# Altium footprint library ModulesFPs.PcbLib: 7 footprints (part 3 of 6) (continued)
## ARDUINO MEGA 2560 PRO M-SHIELD [mm] (continued)
3D body: height 7, standoff 0, extent 2.007,-48.793 3.073,-48.742
3D body: height 7, standoff 0, extent 2.007,-48.793 2.057,-47.726
3D body: height 8, standoff 0, extent 1.27,-49.53 1.549,-46.99
3D body: height 0, standoff -3, extent 2.286,-48.387 2.794,-48.133
3D body: height 8, standoff 0, extent 3.531,-49.53 3.81,-46.99
3D body: height 8, standoff 0, extent 1.27,-49.53 3.81,-49.251
3D body: height 7.5, standoff 0, extent 2.007,-48.793 2.032,-47.727
3D body: height 7.5, standoff 0, extent 2.007,-47.752 3.074,-47.727
3D body: height 7, standoff 0, extent 2.007,-47.777 3.073,-47.726
3D body: height 7.5, standoff 0, extent 3.048,-46.253 3.073,-45.187
3D body: height 7.5, standoff 0, extent 2.007,-46.253 3.073,-46.228
3D body: height 8, standoff 7.5, extent 1.524,-46.728 3.556,-46.228
3D body: height 8, standoff 7.5, extent 1.524,-45.212 3.556,-44.711
3D body: height 8, standoff 7.5, extent 1.532,-46.761 2.032,-44.729
3D body: height 8, standoff 0, extent 1.27,-44.729 3.81,-44.45
3D body: height 1, standoff 0, extent 1.905,-46.355 3.175,-45.085
3D body: height 7, standoff 0, extent 3.023,-46.253 3.073,-45.186
3D body: height 7, standoff 0, extent 2.007,-46.253 3.073,-46.202
3D body: height 7, standoff 0, extent 2.007,-46.253 2.057,-45.186
3D body: height 8, standoff 0, extent 1.27,-46.99 1.549,-44.45
3D body: height 0, standoff -3, extent 2.286,-45.847 2.794,-45.593
3D body: height 8, standoff 0, extent 3.531,-46.99 3.81,-44.45
3D body: height 8, standoff 0, extent 1.27,-46.99 3.81,-46.711
3D body: height 7.5, standoff 0, extent 2.007,-46.253 2.032,-45.187
3D body: height 7.5, standoff 0, extent 2.007,-45.212 3.074,-45.187
3D body: height 7, standoff 0, extent 2.007,-45.237 3.073,-45.186
3D body: height 8, standoff 7.5, extent 0.508,-46.736 1.009,-44.704
3D body: height 7.5, standoff 0, extent 0.508,-48.793 0.533,-47.727
3D body: height 7.5, standoff 0, extent -0.533,-48.793 0.533,-48.768
3D body: height 8, standoff 7.5, extent -1.016,-49.268 1.016,-48.768
3D body: height 8, standoff 7.5, extent 0.508,-49.276 1.009,-47.244
3D body: height 8, standoff 7.5, extent -1.016,-47.752 1.016,-47.251
3D body: height 8, standoff 7.5, extent -1.008,-49.301 -0.508,-47.269
3D body: height 8, standoff 0, extent -1.27,-47.269 1.27,-46.99
3D body: height 1, standoff 0, extent -0.635,-48.895 0.635,-47.625
3D body: height 7, standoff 0, extent 0.483,-48.793 0.533,-47.726
3D body: height 7, standoff 0, extent -0.533,-48.793 0.533,-48.742
3D body: height 7, standoff 0, extent -0.533,-48.793 -0.483,-47.726
3D body: height 8, standoff 0, extent -1.27,-49.53 -0.991,-46.99
3D body: height 0, standoff -3, extent -0.254,-48.387 0.254,-48.133
3D body: height 8, standoff 0, extent 0.991,-49.53 1.27,-46.99
3D body: height 8, standoff 0, extent -1.27,-49.53 1.27,-49.251
3D body: height 7.5, standoff 0, extent -0.533,-48.793 -0.508,-47.727
3D body: height 7.5, standoff 0, extent -0.533,-47.752 0.534,-47.727
3D body: height 7, standoff 0, extent -0.533,-47.777 0.533,-47.726
3D body: height 7.5, standoff 0, extent 0.508,-46.253 0.533,-45.187
3D body: height 7.5, standoff 0, extent -0.533,-46.253 0.533,-46.228
3D body: height 8, standoff 7.5, extent -1.016,-46.728 1.016,-46.228
3D body: height 8, standoff 7.5, extent -1.016,-45.212 1.016,-44.711
3D body: height 8, standoff 7.5, extent -1.008,-46.761 -0.508,-44.729
3D body: height 8, standoff 0, extent -1.27,-44.729 1.27,-44.45
3D body: height 1, standoff 0, extent -0.635,-46.355 0.635,-45.085
3D body: height 7, standoff 0, extent 0.483,-46.253 0.533,-45.186
3D body: height 7, standoff 0, extent -0.533,-46.253 0.533,-46.202
3D body: height 7, standoff 0, extent -0.533,-46.253 -0.483,-45.186
3D body: height 8, standoff 0, extent -1.27,-46.99 -0.991,-44.45
3D body: height 0, standoff -3, extent -0.254,-45.847 0.254,-45.593
3D body: height 8, standoff 0, extent 0.991,-46.99 1.27,-44.45
3D body: height 8, standoff 0, extent -1.27,-46.99 1.27,-46.711
3D body: height 7.5, standoff 0, extent -0.533,-46.253 -0.508,-45.187
3D body: height 7.5, standoff 0, extent -0.533,-45.212 0.534,-45.187
3D body: height 7, standoff 0, extent -0.533,-45.237 0.533,-45.186
3D body: height 8, standoff 7.5, extent 3.048,-41.656 3.549,-39.624
3D body: height 7.5, standoff 0, extent 3.048,-43.713 3.074,-42.647
3D body: height 7.5, standoff 0, extent 2.007,-43.713 3.073,-43.688
3D body: height 8, standoff 7.5, extent 1.524,-44.188 3.556,-43.688
3D body: height 8, standoff 7.5, extent 3.048,-44.196 3.549,-42.164
3D body: height 8, standoff 7.5, extent 1.524,-42.672 3.556,-42.172
3D body: height 8, standoff 7.5, extent 1.532,-44.221 2.032,-42.189
3D body: height 8, standoff 0, extent 1.27,-42.189 3.81,-41.91
3D body: height 1, standoff 0, extent 1.905,-43.815 3.175,-42.545
3D body: height 7, standoff 0, extent 3.023,-43.713 3.073,-42.647
3D body: height 7, standoff 0, extent 2.007,-43.713 3.073,-43.663
3D body: height 7, standoff 0, extent 2.007,-43.713 2.057,-42.647
3D body: height 8, standoff 0, extent 1.27,-44.45 1.55,-41.91
3D body: height 0, standoff -3, extent 2.286,-43.307 2.794,-43.053
3D body: height 8, standoff 0, extent 3.531,-44.45 3.81,-41.91
3D body: height 8, standoff 0, extent 1.27,-44.45 3.81,-44.171
3D body: height 7.5, standoff 0, extent 2.007,-43.713 2.032,-42.647
3D body: height 7.5, standoff 0, extent 2.007,-42.672 3.074,-42.647
3D body: height 7, standoff 0, extent 2.007,-42.697 3.073,-42.646
3D body: height 7.5, standoff 0, extent 3.048,-41.173 3.074,-40.107
3D body: height 7.5, standoff 0, extent 2.007,-41.173 3.073,-41.148
3D body: height 8, standoff 7.5, extent 1.524,-41.648 3.556,-41.148
3D body: height 8, standoff 7.5, extent 1.524,-40.132 3.556,-39.632
3D body: height 8, standoff 7.5, extent 1.532,-41.681 2.032,-39.649
3D body: height 8, standoff 0, extent 1.27,-39.649 3.81,-39.37
3D body: height 1, standoff 0, extent 1.905,-41.275 3.175,-40.005
3D body: height 7, standoff 0, extent 3.023,-41.173 3.073,-40.107
3D body: height 7, standoff 0, extent 2.007,-41.173 3.073,-41.123
3D body: height 7, standoff 0, extent 2.007,-41.173 2.057,-40.107
3D body: height 8, standoff 0, extent 1.27,-41.91 1.55,-39.37
3D body: height 0, standoff -3, extent 2.286,-40.767 2.794,-40.513
3D body: height 8, standoff 0, extent 3.531,-41.91 3.81,-39.37
3D body: height 8, standoff 0, extent 1.27,-41.91 3.81,-41.631
3D body: height 7.5, standoff 0, extent 2.007,-41.173 2.032,-40.107
3D body: height 7.5, standoff 0, extent 2.007,-40.132 3.074,-40.107
3D body: height 7, standoff 0, extent 2.007,-40.157 3.073,-40.106
3D body: height 8, standoff 7.5, extent 0.508,-41.656 1.009,-39.624
3D body: height 7.5, standoff 0, extent 0.508,-43.713 0.534,-42.647
3D body: height 7.5, standoff 0, extent -0.533,-43.713 0.533,-43.688
3D body: height 8, standoff 7.5, extent -1.016,-44.188 1.016,-43.688
3D body: height 8, standoff 7.5, extent 0.508,-44.196 1.009,-42.164
3D body: height 8, standoff 7.5, extent -1.016,-42.672 1.016,-42.172
3D body: height 8, standoff 7.5, extent -1.008,-44.221 -0.508,-42.189
3D body: height 8, standoff 0, extent -1.27,-42.189 1.27,-41.91
3D body: height 1, standoff 0, extent -0.635,-43.815 0.635,-42.545
3D body: height 7, standoff 0, extent 0.483,-43.713 0.533,-42.647
3D body: height 7, standoff 0, extent -0.533,-43.713 0.533,-43.663
3D body: height 7, standoff 0, extent -0.533,-43.713 -0.483,-42.647
3D body: height 8, standoff 0, extent -1.27,-44.45 -0.99,-41.91
3D body: height 0, standoff -3, extent -0.254,-43.307 0.254,-43.053
3D body: height 8, standoff 0, extent 0.991,-44.45 1.27,-41.91
3D body: height 8, standoff 0, extent -1.27,-44.45 1.27,-44.171
3D body: height 7.5, standoff 0, extent -0.533,-43.713 -0.508,-42.647
3D body: height 7.5, standoff 0, extent -0.533,-42.672 0.534,-42.647
3D body: height 7, standoff 0, extent -0.533,-42.697 0.533,-42.646
3D body: height 7.5, standoff 0, extent 0.508,-41.173 0.534,-40.107
3D body: height 7.5, standoff 0, extent -0.533,-41.173 0.533,-41.148
3D body: height 8, standoff 7.5, extent -1.016,-41.648 1.016,-41.148
3D body: height 8, standoff 7.5, extent -1.016,-40.132 1.016,-39.632
3D body: height 8, standoff 7.5, extent -1.008,-41.681 -0.508,-39.649
3D body: height 8, standoff 0, extent -1.27,-39.649 1.27,-39.37
3D body: height 1, standoff 0, extent -0.635,-41.275 0.635,-40.005
3D body: height 7, standoff 0, extent 0.483,-41.173 0.533,-40.107
3D body: height 7, standoff 0, extent -0.533,-41.173 0.533,-41.123
3D body: height 7, standoff 0, extent -0.533,-41.173 -0.483,-40.107
3D body: height 8, standoff 0, extent -1.27,-41.91 -0.99,-39.37
3D body: height 0, standoff -3, extent -0.254,-40.767 0.254,-40.513
3D body: height 8, standoff 0, extent 0.991,-41.91 1.27,-39.37
3D body: height 8, standoff 0, extent -1.27,-41.91 1.27,-41.631
3D body: height 7.5, standoff 0, extent -0.533,-41.173 -0.508,-40.107
3D body: height 7.5, standoff 0, extent -0.533,-40.132 0.534,-40.107
3D body: height 7, standoff 0, extent -0.533,-40.157 0.533,-40.106
3D body: height 8, standoff 7.5, extent 3.048,-36.576 3.548,-34.544
3D body: height 7.5, standoff 0, extent 3.048,-38.633 3.073,-37.567
3D body: height 7.5, standoff 0, extent 2.007,-38.633 3.073,-38.608
3D body: height 8, standoff 7.5, extent 1.524,-39.108 3.556,-38.608
3D body: height 8, standoff 7.5, extent 3.048,-39.116 3.548,-37.084
3D body: height 8, standoff 7.5, extent 1.524,-37.592 3.556,-37.091
3D body: height 8, standoff 7.5, extent 1.532,-39.141 2.032,-37.109
3D body: height 8, standoff 0, extent 1.27,-37.109 3.81,-36.83
3D body: height 1, standoff 0, extent 1.905,-38.735 3.175,-37.465
3D body: height 7, standoff 0, extent 3.022,-38.633 3.073,-37.566
3D body: height 7, standoff 0, extent 2.006,-38.633 3.073,-38.582
3D body: height 7, standoff 0, extent 2.006,-38.633 2.057,-37.566
3D body: height 8, standoff 0, extent 1.27,-39.37 1.549,-36.83
3D body: height 0, standoff -3, extent 2.286,-38.227 2.794,-37.973
3D body: height 8, standoff 0, extent 3.531,-39.37 3.81,-36.83
3D body: height 8, standoff 0, extent 1.27,-39.37 3.81,-39.09
3D body: height 7.5, standoff 0, extent 2.007,-38.633 2.032,-37.566
3D body: height 7.5, standoff 0, extent 2.007,-37.592 3.073,-37.566
3D body: height 7, standoff 0, extent 2.007,-37.617 3.073,-37.566
3D body: height 7.5, standoff 0, extent 3.048,-36.093 3.073,-35.027
3D body: height 7.5, standoff 0, extent 2.007,-36.093 3.073,-36.068
3D body: height 8, standoff 7.5, extent 1.524,-36.568 3.556,-36.068
3D body: height 8, standoff 7.5, extent 1.524,-35.052 3.556,-34.551
3D body: height 8, standoff 7.5, extent 1.532,-36.601 2.032,-34.569
3D body: height 8, standoff 0, extent 1.27,-34.569 3.81,-34.29
3D body: height 1, standoff 0, extent 1.905,-36.195 3.175,-34.925
3D body: height 7, standoff 0, extent 3.022,-36.093 3.073,-35.026
3D body: height 7, standoff 0, extent 2.006,-36.093 3.073,-36.042
3D body: height 7, standoff 0, extent 2.006,-36.093 2.057,-35.026
3D body: height 8, standoff 0, extent 1.27,-36.83 1.549,-34.29
3D body: height 0, standoff -3, extent 2.286,-35.687 2.794,-35.433
3D body: height 8, standoff 0, extent 3.531,-36.83 3.81,-34.29
3D body: height 8, standoff 0, extent 1.27,-36.83 3.81,-36.55
3D body: height 7.5, standoff 0, extent 2.007,-36.093 2.032,-35.026
3D body: height 7.5, standoff 0, extent 2.007,-35.052 3.073,-35.026
3D body: height 7, standoff 0, extent 2.007,-35.077 3.073,-35.026
3D body: height 8, standoff 7.5, extent 0.508,-36.576 1.008,-34.544
3D body: height 7.5, standoff 0, extent 0.508,-38.633 0.533,-37.567
3D body: height 7.5, standoff 0, extent -0.533,-38.633 0.533,-38.608
3D body: height 8, standoff 7.5, extent -1.016,-39.108 1.016,-38.608
3D body: height 8, standoff 7.5, extent 0.508,-39.116 1.008,-37.084
3D body: height 8, standoff 7.5, extent -1.016,-37.592 1.016,-37.091
3D body: height 8, standoff 7.5, extent -1.008,-39.141 -0.508,-37.109
3D body: height 8, standoff 0, extent -1.27,-37.109 1.27,-36.83
3D body: height 1, standoff 0, extent -0.635,-38.735 0.635,-37.465
3D body: height 7, standoff 0, extent 0.482,-38.633 0.533,-37.566
3D body: height 7, standoff 0, extent -0.534,-38.633 0.533,-38.582
3D body: height 7, standoff 0, extent -0.534,-38.633 -0.483,-37.566
3D body: height 8, standoff 0, extent -1.27,-39.37 -0.991,-36.83
3D body: height 0, standoff -3, extent -0.254,-38.227 0.254,-37.973
3D body: height 8, standoff 0, extent 0.991,-39.37 1.27,-36.83
3D body: height 8, standoff 0, extent -1.27,-39.37 1.27,-39.09
3D body: height 7.5, standoff 0, extent -0.533,-38.633 -0.508,-37.566
3D body: height 7.5, standoff 0, extent -0.533,-37.592 0.533,-37.566
3D body: height 7, standoff 0, extent -0.533,-37.617 0.533,-37.566
3D body: height 7.5, standoff 0, extent 0.508,-36.093 0.533,-35.027
3D body: height 7.5, standoff 0, extent -0.533,-36.093 0.533,-36.068
3D body: height 8, standoff 7.5, extent -1.016,-36.568 1.016,-36.068
3D body: height 8, standoff 7.5, extent -1.016,-35.052 1.016,-34.551
3D body: height 8, standoff 7.5, extent -1.008,-36.601 -0.508,-34.569
3D body: height 8, standoff 0, extent -1.27,-34.569 1.27,-34.29
3D body: height 1, standoff 0, extent -0.635,-36.195 0.635,-34.925
3D body: height 7, standoff 0, extent 0.482,-36.093 0.533,-35.026
3D body: height 7, standoff 0, extent -0.534,-36.093 0.533,-36.042
3D body: height 7, standoff 0, extent -0.534,-36.093 -0.483,-35.026
3D body: height 8, standoff 0, extent -1.27,-36.83 -0.991,-34.29
3D body: height 0, standoff -3, extent -0.254,-35.687 0.254,-35.433
3D body: height 8, standoff 0, extent 0.991,-36.83 1.27,-34.29
3D body: height 8, standoff 0, extent -1.27,-36.83 1.27,-36.55
3D body: height 7.5, standoff 0, extent -0.533,-36.093 -0.508,-35.026
3D body: height 7.5, standoff 0, extent -0.533,-35.052 0.533,-35.026
3D body: height 7, standoff 0, extent -0.533,-35.077 0.533,-35.026
3D body: height 8, standoff 7.5, extent 3.048,-31.496 3.549,-29.464
3D body: height 7.5, standoff 0, extent 3.048,-33.553 3.073,-32.487
3D body: height 7.5, standoff 0, extent 2.007,-33.553 3.073,-33.528
3D body: height 8, standoff 7.5, extent 1.524,-34.028 3.556,-33.528
3D body: height 8, standoff 7.5, extent 3.048,-34.036 3.549,-32.004
3D body: height 8, standoff 7.5, extent 1.524,-32.512 3.556,-32.011
3D body: height 8, standoff 7.5, extent 1.532,-34.061 2.032,-32.029
3D body: height 8, standoff 0, extent 1.27,-32.029 3.81,-31.75
3D body: height 1, standoff 0, extent 1.905,-33.655 3.175,-32.385
3D body: height 7, standoff 0, extent 3.023,-33.553 3.073,-32.486
3D body: height 7, standoff 0, extent 2.007,-33.553 3.073,-33.502
3D body: height 7, standoff 0, extent 2.007,-33.553 2.057,-32.486
3D body: height 8, standoff 0, extent 1.27,-34.29 1.549,-31.75
3D body: height 0, standoff -3, extent 2.286,-33.147 2.794,-32.893
3D body: height 8, standoff 0, extent 3.531,-34.29 3.81,-31.75
3D body: height 8, standoff 0, extent 1.27,-34.29 3.81,-34.011
3D body: height 7.5, standoff 0, extent 2.007,-33.553 2.032,-32.487
3D body: height 7.5, standoff 0, extent 2.007,-32.512 3.074,-32.487
3D body: height 7, standoff 0, extent 2.007,-32.537 3.073,-32.486
3D body: height 7.5, standoff 0, extent 3.048,-31.013 3.073,-29.947
3D body: height 7.5, standoff 0, extent 2.007,-31.013 3.073,-30.988
3D body: height 8, standoff 7.5, extent 1.524,-31.488 3.556,-30.988
3D body: height 8, standoff 7.5, extent 1.524,-29.972 3.556,-29.471
3D body: height 8, standoff 7.5, extent 1.532,-31.521 2.032,-29.489
3D body: height 8, standoff 0, extent 1.27,-29.489 3.81,-29.21
3D body: height 1, standoff 0, extent 1.905,-31.115 3.175,-29.845
3D body: height 7, standoff 0, extent 3.023,-31.013 3.073,-29.946
3D body: height 7, standoff 0, extent 2.007,-31.013 3.073,-30.962
3D body: height 7, standoff 0, extent 2.007,-31.013 2.057,-29.946
3D body: height 8, standoff 0, extent 1.27,-31.75 1.549,-29.21
3D body: height 0, standoff -3, extent 2.286,-30.607 2.794,-30.353
3D body: height 8, standoff 0, extent 3.531,-31.75 3.81,-29.21
3D body: height 8, standoff 0, extent 1.27,-31.75 3.81,-31.471
3D body: height 7.5, standoff 0, extent 2.007,-31.013 2.032,-29.947
3D body: height 7.5, standoff 0, extent 2.007,-29.972 3.074,-29.947
3D body: height 7, standoff 0, extent 2.007,-29.997 3.073,-29.946
3D body: height 8, standoff 7.5, extent 0.508,-31.496 1.009,-29.464
3D body: height 7.5, standoff 0, extent 0.508,-33.553 0.533,-32.487
3D body: height 7.5, standoff 0, extent -0.533,-33.553 0.533,-33.528
3D body: height 8, standoff 7.5, extent -1.016,-34.028 1.016,-33.528
3D body: height 8, standoff 7.5, extent 0.508,-34.036 1.009,-32.004
3D body: height 8, standoff 7.5, extent -1.016,-32.512 1.016,-32.011
3D body: height 8, standoff 7.5, extent -1.008,-34.061 -0.508,-32.029
3D body: height 8, standoff 0, extent -1.27,-32.029 1.27,-31.75
3D body: height 1, standoff 0, extent -0.635,-33.655 0.635,-32.385
3D body: height 7, standoff 0, extent 0.483,-33.553 0.533,-32.486
3D body: height 7, standoff 0, extent -0.533,-33.553 0.533,-33.502
3D body: height 7, standoff 0, extent -0.533,-33.553 -0.483,-32.486
3D body: height 8, standoff 0, extent -1.27,-34.29 -0.991,-31.75
3D body: height 0, standoff -3, extent -0.254,-33.147 0.254,-32.893
3D body: height 8, standoff 0, extent 0.991,-34.29 1.27,-31.75
3D body: height 8, standoff 0, extent -1.27,-34.29 1.27,-34.011
3D body: height 7.5, standoff 0, extent -0.533,-33.553 -0.508,-32.487
3D body: height 7.5, standoff 0, extent -0.533,-32.512 0.534,-32.487
3D body: height 7, standoff 0, extent -0.533,-32.537 0.533,-32.486
3D body: height 7.5, standoff 0, extent 0.508,-31.013 0.533,-29.947
3D body: height 7.5, standoff 0, extent -0.533,-31.013 0.533,-30.988
3D body: height 8, standoff 7.5, extent -1.016,-31.488 1.016,-30.988
3D body: height 8, standoff 7.5, extent -1.016,-29.972 1.016,-29.471
3D body: height 8, standoff 7.5, extent -1.008,-31.521 -0.508,-29.489
3D body: height 8, standoff 0, extent -1.27,-29.489 1.27,-29.21
3D body: height 1, standoff 0, extent -0.635,-31.115 0.635,-29.845
3D body: height 7, standoff 0, extent 0.483,-31.013 0.533,-29.946
3D body: height 7, standoff 0, extent -0.533,-31.013 0.533,-30.962
3D body: height 7, standoff 0, extent -0.533,-31.013 -0.483,-29.946
3D body: height 8, standoff 0, extent -1.27,-31.75 -0.991,-29.21
3D body: height 0, standoff -3, extent -0.254,-30.607 0.254,-30.353
3D body: height 8, standoff 0, extent 0.991,-31.75 1.27,-29.21
3D body: height 8, standoff 0, extent -1.27,-31.75 1.27,-31.471
3D body: height 7.5, standoff 0, extent -0.533,-31.013 -0.508,-29.947
3D body: height 7.5, standoff 0, extent -0.533,-29.972 0.534,-29.947
3D body: height 7, standoff 0, extent -0.533,-29.997 0.533,-29.946
3D body: height 8, standoff 7.5, extent 3.048,-26.416 3.549,-24.384
3D body: height 7.5, standoff 0, extent 3.048,-28.473 3.073,-27.407
3D body: height 7.5, standoff 0, extent 2.007,-28.473 3.073,-28.448
3D body: height 8, standoff 7.5, extent 1.524,-28.948 3.556,-28.448
3D body: height 8, standoff 7.5, extent 3.048,-28.956 3.549,-26.924
3D body: height 8, standoff 7.5, extent 1.524,-27.432 3.556,-26.931
3D body: height 8, standoff 7.5, extent 1.532,-28.981 2.032,-26.949
3D body: height 8, standoff 0, extent 1.27,-26.949 3.81,-26.67
3D body: height 1, standoff 0, extent 1.905,-28.575 3.175,-27.305
3D body: height 7, standoff 0, extent 3.023,-28.473 3.073,-27.406
3D body: height 7, standoff 0, extent 2.007,-28.473 3.073,-28.422
3D body: height 7, standoff 0, extent 2.007,-28.473 2.057,-27.406
3D body: height 8, standoff 0, extent 1.27,-29.21 1.549,-26.67
3D body: height 0, standoff -3, extent 2.286,-28.067 2.794,-27.813
3D body: height 8, standoff 0, extent 3.531,-29.21 3.81,-26.67
3D body: height 8, standoff 0, extent 1.27,-29.21 3.81,-28.931
3D body: height 7.5, standoff 0, extent 2.007,-28.473 2.032,-27.407
3D body: height 7.5, standoff 0, extent 2.007,-27.432 3.074,-27.407
3D body: height 7, standoff 0, extent 2.007,-27.457 3.073,-27.406
3D body: height 7.5, standoff 0, extent 3.048,-25.933 3.073,-24.867
3D body: height 7.5, standoff 0, extent 2.007,-25.933 3.073,-25.908
3D body: height 8, standoff 7.5, extent 1.524,-26.408 3.556,-25.908
3D body: height 8, standoff 7.5, extent 1.524,-24.892 3.556,-24.391
3D body: height 8, standoff 7.5, extent 1.532,-26.441 2.032,-24.409
3D body: height 8, standoff 0, extent 1.27,-24.409 3.81,-24.13
3D body: height 1, standoff 0, extent 1.905,-26.035 3.175,-24.765
3D body: height 7, standoff 0, extent 3.023,-25.933 3.073,-24.866
3D body: height 7, standoff 0, extent 2.007,-25.933 3.073,-25.882
3D body: height 7, standoff 0, extent 2.007,-25.933 2.057,-24.866
3D body: height 8, standoff 0, extent 1.27,-26.67 1.549,-24.13
3D body: height 0, standoff -3, extent 2.286,-25.527 2.794,-25.273
3D body: height 8, standoff 0, extent 3.531,-26.67 3.81,-24.13
3D body: height 8, standoff 0, extent 1.27,-26.67 3.81,-26.391
3D body: height 7.5, standoff 0, extent 2.007,-25.933 2.032,-24.867
3D body: height 7.5, standoff 0, extent 2.007,-24.892 3.074,-24.867
3D body: height 7, standoff 0, extent 2.007,-24.917 3.073,-24.866
3D body: height 8, standoff 7.5, extent 0.508,-26.416 1.009,-24.384
3D body: height 7.5, standoff 0, extent 0.508,-28.473 0.533,-27.407
3D body: height 7.5, standoff 0, extent -0.533,-28.473 0.533,-28.448
3D body: height 8, standoff 7.5, extent -1.016,-28.948 1.016,-28.448
3D body: height 8, standoff 7.5, extent 0.508,-28.956 1.009,-26.924
3D body: height 8, standoff 7.5, extent -1.016,-27.432 1.016,-26.931
3D body: height 8, standoff 7.5, extent -1.008,-28.981 -0.508,-26.949
3D body: height 8, standoff 0, extent -1.27,-26.949 1.27,-26.67
3D body: height 1, standoff 0, extent -0.635,-28.575 0.635,-27.305
3D body: height 7, standoff 0, extent 0.483,-28.473 0.533,-27.406
3D body: height 7, standoff 0, extent -0.533,-28.473 0.533,-28.422
3D body: height 7, standoff 0, extent -0.533,-28.473 -0.483,-27.406
3D body: height 8, standoff 0, extent -1.27,-29.21 -0.991,-26.67
3D body: height 0, standoff -3, extent -0.254,-28.067 0.254,-27.813
3D body: height 8, standoff 0, extent 0.991,-29.21 1.27,-26.67
3D body: height 8, standoff 0, extent -1.27,-29.21 1.27,-28.931
3D body: height 7.5, standoff 0, extent -0.533,-28.473 -0.508,-27.407
3D body: height 7.5, standoff 0, extent -0.533,-27.432 0.534,-27.407
3D body: height 7, standoff 0, extent -0.533,-27.457 0.533,-27.406
3D body: height 7.5, standoff 0, extent 0.508,-25.933 0.533,-24.867
3D body: height 7.5, standoff 0, extent -0.533,-25.933 0.533,-25.908
3D body: height 8, standoff 7.5, extent -1.016,-26.408 1.016,-25.908
3D body: height 8, standoff 7.5, extent -1.016,-24.892 1.016,-24.391
3D body: height 8, standoff 7.5, extent -1.008,-26.441 -0.508,-24.409
3D body: height 8, standoff 0, extent -1.27,-24.409 1.27,-24.13
3D body: height 1, standoff 0, extent -0.635,-26.035 0.635,-24.765
3D body: height 7, standoff 0, extent 0.483,-25.933 0.533,-24.866
3D body: height 7, standoff 0, extent -0.533,-25.933 0.533,-25.882
3D body: height 7, standoff 0, extent -0.533,-25.933 -0.483,-24.866
3D body: height 8, standoff 0, extent -1.27,-26.67 -0.991,-24.13
3D body: height 0, standoff -3, extent -0.254,-25.527 0.254,-25.273
3D body: height 8, standoff 0, extent 0.991,-26.67 1.27,-24.13
3D body: height 8, standoff 0, extent -1.27,-26.67 1.27,-26.391
3D body: height 7.5, standoff 0, extent -0.533,-25.933 -0.508,-24.867
3D body: height 7.5, standoff 0, extent -0.533,-24.892 0.534,-24.867
3D body: height 7, standoff 0, extent -0.533,-24.917 0.533,-24.866
3D body: height 8, standoff 7.5, extent 3.048,-21.336 3.549,-19.304
3D body: height 7.5, standoff 0, extent 3.048,-23.393 3.074,-22.327
3D body: height 7.5, standoff 0, extent 2.007,-23.393 3.073,-23.368
3D body: height 8, standoff 7.5, extent 1.524,-23.868 3.556,-23.368
3D body: height 8, standoff 7.5, extent 3.048,-23.876 3.549,-21.844
3D body: height 8, standoff 7.5, extent 1.524,-22.352 3.556,-21.852
3D body: height 8, standoff 7.5, extent 1.532,-23.901 2.032,-21.869
3D body: height 8, standoff 0, extent 1.27,-21.869 3.81,-21.59
3D body: height 1, standoff 0, extent 1.905,-23.495 3.175,-22.225
3D body: height 7, standoff 0, extent 3.023,-23.393 3.073,-22.327
3D body: height 7, standoff 0, extent 2.007,-23.393 3.073,-23.343
3D body: height 7, standoff 0, extent 2.007,-23.393 2.057,-22.327
3D body: height 8, standoff 0, extent 1.27,-24.13 1.55,-21.59
3D body: height 0, standoff -3, extent 2.286,-22.987 2.794,-22.733
3D body: height 8, standoff 0, extent 3.531,-24.13 3.81,-21.59
3D body: height 8, standoff 0, extent 1.27,-24.13 3.81,-23.851
3D body: height 7.5, standoff 0, extent 2.007,-23.393 2.032,-22.327
3D body: height 7.5, standoff 0, extent 2.007,-22.352 3.074,-22.327
3D body: height 7, standoff 0, extent 2.007,-22.377 3.073,-22.326
3D body: height 7.5, standoff 0, extent 3.048,-20.853 3.074,-19.787
3D body: height 7.5, standoff 0, extent 2.007,-20.853 3.073,-20.828
3D body: height 8, standoff 7.5, extent 1.524,-21.328 3.556,-20.828
3D body: height 8, standoff 7.5, extent 1.524,-19.812 3.556,-19.312
3D body: height 8, standoff 7.5, extent 1.532,-21.361 2.032,-19.329
3D body: height 8, standoff 0, extent 1.27,-19.329 3.81,-19.05
3D body: height 1, standoff 0, extent 1.905,-20.955 3.175,-19.685
3D body: height 7, standoff 0, extent 3.023,-20.853 3.073,-19.787
3D body: height 7, standoff 0, extent 2.007,-20.853 3.073,-20.803
3D body: height 7, standoff 0, extent 2.007,-20.853 2.057,-19.787
3D body: height 8, standoff 0, extent 1.27,-21.59 1.55,-19.05
3D body: height 0, standoff -3, extent 2.286,-20.447 2.794,-20.193
3D body: height 8, standoff 0, extent 3.531,-21.59 3.81,-19.05
3D body: height 8, standoff 0, extent 1.27,-21.59 3.81,-21.311
3D body: height 7.5, standoff 0, extent 2.007,-20.853 2.032,-19.787
3D body: height 7.5, standoff 0, extent 2.007,-19.812 3.074,-19.787
3D body: height 7, standoff 0, extent 2.007,-19.837 3.073,-19.786
3D body: height 8, standoff 7.5, extent 0.508,-21.336 1.009,-19.304
3D body: height 7.5, standoff 0, extent 0.508,-23.393 0.534,-22.327
3D body: height 7.5, standoff 0, extent -0.533,-23.393 0.533,-23.368
3D body: height 8, standoff 7.5, extent -1.016,-23.868 1.016,-23.368
3D body: height 8, standoff 7.5, extent 0.508,-23.876 1.009,-21.844
3D body: height 8, standoff 7.5, extent -1.016,-22.352 1.016,-21.852
3D body: height 8, standoff 7.5, extent -1.008,-23.901 -0.508,-21.869
3D body: height 8, standoff 0, extent -1.27,-21.869 1.27,-21.59
3D body: height 1, standoff 0, extent -0.635,-23.495 0.635,-22.225
3D body: height 7, standoff 0, extent 0.483,-23.393 0.533,-22.327
3D body: height 7, standoff 0, extent -0.533,-23.393 0.533,-23.343
3D body: height 7, standoff 0, extent -0.533,-23.393 -0.483,-22.327
3D body: height 8, standoff 0, extent -1.27,-24.13 -0.99,-21.59
3D body: height 0, standoff -3, extent -0.254,-22.987 0.254,-22.733
3D body: height 8, standoff 0, extent 0.991,-24.13 1.27,-21.59
3D body: height 8, standoff 0, extent -1.27,-24.13 1.27,-23.851
3D body: height 7.5, standoff 0, extent -0.533,-23.393 -0.508,-22.327
3D body: height 7.5, standoff 0, extent -0.533,-22.352 0.534,-22.327
3D body: height 7, standoff 0, extent -0.533,-22.377 0.533,-22.326
3D body: height 7.5, standoff 0, extent 0.508,-20.853 0.534,-19.787
3D body: height 7.5, standoff 0, extent -0.533,-20.853 0.533,-20.828
3D body: height 8, standoff 7.5, extent -1.016,-21.328 1.016,-20.828
3D body: height 8, standoff 7.5, extent -1.016,-19.812 1.016,-19.312
3D body: height 8, standoff 7.5, extent -1.008,-21.361 -0.508,-19.329
3D body: height 8, standoff 0, extent -1.27,-19.329 1.27,-19.05
3D body: height 1, standoff 0, extent -0.635,-20.955 0.635,-19.685
3D body: height 7, standoff 0, extent 0.483,-20.853 0.533,-19.787
3D body: height 7, standoff 0, extent -0.533,-20.853 0.533,-20.803
3D body: height 7, standoff 0, extent -0.533,-20.853 -0.483,-19.787
3D body: height 8, standoff 0, extent -1.27,-21.59 -0.99,-19.05
3D body: height 0, standoff -3, extent -0.254,-20.447 0.254,-20.193
3D body: height 8, standoff 0, extent 0.991,-21.59 1.27,-19.05
3D body: height 8, standoff 0, extent -1.27,-21.59 1.27,-21.311
3D body: height 7.5, standoff 0, extent -0.533,-20.853 -0.508,-19.787
3D body: height 7.5, standoff 0, extent -0.533,-19.812 0.534,-19.787
3D body: height 7, standoff 0, extent -0.533,-19.837 0.533,-19.786
3D body: height 8, standoff 7.5, extent 3.048,-16.256 3.549,-14.224
3D body: height 7.5, standoff 0, extent 3.048,-18.313 3.073,-17.247
3D body: height 7.5, standoff 0, extent 2.007,-18.313 3.073,-18.288
3D body: height 8, standoff 7.5, extent 1.524,-18.788 3.556,-18.288
3D body: height 8, standoff 7.5, extent 3.048,-18.796 3.549,-16.764
3D body: height 8, standoff 7.5, extent 1.524,-17.272 3.556,-16.771
3D body: height 8, standoff 7.5, extent 1.532,-18.821 2.032,-16.789
3D body: height 8, standoff 0, extent 1.27,-16.789 3.81,-16.51
3D body: height 1, standoff 0, extent 1.905,-18.415 3.175,-17.145
3D body: height 7, standoff 0, extent 3.023,-18.313 3.073,-17.246
3D body: height 7, standoff 0, extent 2.007,-18.313 3.073,-18.262
3D body: height 7, standoff 0, extent 2.007,-18.313 2.057,-17.246
3D body: height 8, standoff 0, extent 1.27,-19.05 1.549,-16.51
3D body: height 0, standoff -3, extent 2.286,-17.907 2.794,-17.653
3D body: height 8, standoff 0, extent 3.531,-19.05 3.81,-16.51
3D body: height 8, standoff 0, extent 1.27,-19.05 3.81,-18.771
3D body: height 7.5, standoff 0, extent 2.007,-18.313 2.032,-17.247
3D body: height 7.5, standoff 0, extent 2.007,-17.272 3.074,-17.247
3D body: height 7, standoff 0, extent 2.007,-17.297 3.073,-17.246
3D body: height 7.5, standoff 0, extent 3.048,-15.773 3.073,-14.707
3D body: height 7.5, standoff 0, extent 2.007,-15.773 3.073,-15.748
3D body: height 8, standoff 7.5, extent 1.524,-16.248 3.556,-15.748
3D body: height 8, standoff 7.5, extent 1.524,-14.732 3.556,-14.231
3D body: height 8, standoff 7.5, extent 1.532,-16.281 2.032,-14.249
3D body: height 8, standoff 0, extent 1.27,-14.249 3.81,-13.97
3D body: height 1, standoff 0, extent 1.905,-15.875 3.175,-14.605
3D body: height 7, standoff 0, extent 3.023,-15.773 3.073,-14.706
3D body: height 7, standoff 0, extent 2.007,-15.773 3.073,-15.722
3D body: height 7, standoff 0, extent 2.007,-15.773 2.057,-14.706
3D body: height 8, standoff 0, extent 1.27,-16.51 1.549,-13.97
3D body: height 0, standoff -3, extent 2.286,-15.367 2.794,-15.113
3D body: height 8, standoff 0, extent 3.531,-16.51 3.81,-13.97
3D body: height 8, standoff 0, extent 1.27,-16.51 3.81,-16.231
3D body: height 7.5, standoff 0, extent 2.007,-15.773 2.032,-14.707
3D body: height 7.5, standoff 0, extent 2.007,-14.732 3.074,-14.707
3D body: height 7, standoff 0, extent 2.007,-14.757 3.073,-14.706
3D body: height 8, standoff 7.5, extent 0.508,-16.256 1.009,-14.224
3D body: height 7.5, standoff 0, extent 0.508,-18.313 0.533,-17.247
3D body: height 7.5, standoff 0, extent -0.533,-18.313 0.533,-18.288
3D body: height 8, standoff 7.5, extent -1.016,-18.788 1.016,-18.288
3D body: height 8, standoff 7.5, extent 0.508,-18.796 1.009,-16.764
3D body: height 8, standoff 7.5, extent -1.016,-17.272 1.016,-16.771
3D body: height 8, standoff 7.5, extent -1.008,-18.821 -0.508,-16.789
3D body: height 8, standoff 0, extent -1.27,-16.789 1.27,-16.51
3D body: height 1, standoff 0, extent -0.635,-18.415 0.635,-17.145
3D body: height 7, standoff 0, extent 0.483,-18.313 0.533,-17.246
3D body: height 7, standoff 0, extent -0.533,-18.313 0.533,-18.262
3D body: height 7, standoff 0, extent -0.533,-18.313 -0.483,-17.246
3D body: height 8, standoff 0, extent -1.27,-19.05 -0.991,-16.51
3D body: height 0, standoff -3, extent -0.254,-17.907 0.254,-17.653
3D body: height 8, standoff 0, extent 0.991,-19.05 1.27,-16.51
3D body: height 8, standoff 0, extent -1.27,-19.05 1.27,-18.771
3D body: height 7.5, standoff 0, extent -0.533,-18.313 -0.508,-17.247
3D body: height 7.5, standoff 0, extent -0.533,-17.272 0.534,-17.247
3D body: height 7, standoff 0, extent -0.533,-17.297 0.533,-17.246
3D body: height 7.5, standoff 0, extent 0.508,-15.773 0.533,-14.707
3D body: height 7.5, standoff 0, extent -0.533,-15.773 0.533,-15.748
3D body: height 8, standoff 7.5, extent -1.016,-16.248 1.016,-15.748
3D body: height 8, standoff 7.5, extent -1.016,-14.732 1.016,-14.231
3D body: height 8, standoff 7.5, extent -1.008,-16.281 -0.508,-14.249
3D body: height 8, standoff 0, extent -1.27,-14.249 1.27,-13.97
3D body: height 1, standoff 0, extent -0.635,-15.875 0.635,-14.605
3D body: height 7, standoff 0, extent 0.483,-15.773 0.533,-14.706
3D body: height 7, standoff 0, extent -0.533,-15.773 0.533,-15.722
3D body: height 7, standoff 0, extent -0.533,-15.773 -0.483,-14.706
3D body: height 8, standoff 0, extent -1.27,-16.51 -0.991,-13.97
3D body: height 0, standoff -3, extent -0.254,-15.367 0.254,-15.113
3D body: height 8, standoff 0, extent 0.991,-16.51 1.27,-13.97
3D body: height 8, standoff 0, extent -1.27,-16.51 1.27,-16.231
3D body: height 7.5, standoff 0, extent -0.533,-15.773 -0.508,-14.707
3D body: height 7.5, standoff 0, extent -0.533,-14.732 0.534,-14.707
3D body: height 7, standoff 0, extent -0.533,-14.757 0.533,-14.706
3D body: height 8, standoff 7.5, extent 3.048,-11.176 3.549,-9.144
3D body: height 7.5, standoff 0, extent 3.048,-13.233 3.074,-12.167
3D body: height 7.5, standoff 0, extent 2.007,-13.233 3.073,-13.208
3D body: height 8, standoff 7.5, extent 1.524,-13.708 3.556,-13.208
3D body: height 8, standoff 7.5, extent 3.048,-13.716 3.549,-11.684
3D body: height 8, standoff 7.5, extent 1.524,-12.192 3.556,-11.692
3D body: height 8, standoff 7.5, extent 1.532,-13.741 2.032,-11.709
3D body: height 8, standoff 0, extent 1.27,-11.709 3.81,-11.43
3D body: height 1, standoff 0, extent 1.905,-13.335 3.175,-12.065
3D body: height 7, standoff 0, extent 3.023,-13.233 3.073,-12.167
3D body: height 7, standoff 0, extent 2.007,-13.233 3.073,-13.183
3D body: height 7, standoff 0, extent 2.007,-13.233 2.057,-12.167
3D body: height 8, standoff 0, extent 1.27,-13.97 1.55,-11.43
3D body: height 0, standoff -3, extent 2.286,-12.827 2.794,-12.573
3D body: height 8, standoff 0, extent 3.531,-13.97 3.81,-11.43
3D body: height 8, standoff 0, extent 1.27,-13.97 3.81,-13.691
3D body: height 7.5, standoff 0, extent 2.007,-13.233 2.032,-12.167
3D body: height 7.5, standoff 0, extent 2.007,-12.192 3.074,-12.167
3D body: height 7, standoff 0, extent 2.007,-12.217 3.073,-12.166
3D body: height 7.5, standoff 0, extent 3.048,-10.693 3.074,-9.627
3D body: height 7.5, standoff 0, extent 2.007,-10.693 3.073,-10.668
3D body: height 8, standoff 7.5, extent 1.524,-11.168 3.556,-10.668
3D body: height 8, standoff 7.5, extent 1.524,-9.652 3.556,-9.152
3D body: height 8, standoff 7.5, extent 1.532,-11.201 2.032,-9.169
3D body: height 8, standoff 0, extent 1.27,-9.169 3.81,-8.89
3D body: height 1, standoff 0, extent 1.905,-10.795 3.175,-9.525
3D body: height 7, standoff 0, extent 3.023,-10.693 3.073,-9.627
3D body: height 7, standoff 0, extent 2.007,-10.693 3.073,-10.643
3D body: height 7, standoff 0, extent 2.007,-10.693 2.057,-9.627
3D body: height 8, standoff 0, extent 1.27,-11.43 1.55,-8.89
3D body: height 0, standoff -3, extent 2.286,-10.287 2.794,-10.033
3D body: height 8, standoff 0, extent 3.531,-11.43 3.81,-8.89
3D body: height 8, standoff 0, extent 1.27,-11.43 3.81,-11.151
3D body: height 7.5, standoff 0, extent 2.007,-10.693 2.032,-9.627
3D body: height 7.5, standoff 0, extent 2.007,-9.652 3.074,-9.627
3D body: height 7, standoff 0, extent 2.007,-9.677 3.073,-9.626
3D body: height 8, standoff 7.5, extent 0.508,-11.176 1.009,-9.144
3D body: height 7.5, standoff 0, extent 0.508,-13.233 0.534,-12.167
3D body: height 7.5, standoff 0, extent -0.533,-13.233 0.533,-13.208
3D body: height 8, standoff 7.5, extent -1.016,-13.708 1.016,-13.208
3D body: height 8, standoff 7.5, extent 0.508,-13.716 1.009,-11.684
3D body: height 8, standoff 7.5, extent -1.016,-12.192 1.016,-11.692
3D body: height 8, standoff 7.5, extent -1.008,-13.741 -0.508,-11.709
3D body: height 8, standoff 0, extent -1.27,-11.709 1.27,-11.43
3D body: height 1, standoff 0, extent -0.635,-13.335 0.635,-12.065
3D body: height 7, standoff 0, extent 0.483,-13.233 0.533,-12.167
3D body: height 7, standoff 0, extent -0.533,-13.233 0.533,-13.183
3D body: height 7, standoff 0, extent -0.533,-13.233 -0.483,-12.167
3D body: height 8, standoff 0, extent -1.27,-13.97 -0.99,-11.43
3D body: height 0, standoff -3, extent -0.254,-12.827 0.254,-12.573
3D body: height 8, standoff 0, extent 0.991,-13.97 1.27,-11.43
3D body: height 8, standoff 0, extent -1.27,-13.97 1.27,-13.691
3D body: height 7.5, standoff 0, extent -0.533,-13.233 -0.508,-12.167
3D body: height 7.5, standoff 0, extent -0.533,-12.192 0.534,-12.167
3D body: height 7, standoff 0, extent -0.533,-12.217 0.533,-12.166
3D body: height 7.5, standoff 0, extent 0.508,-10.693 0.534,-9.627
3D body: height 7.5, standoff 0, extent -0.533,-10.693 0.533,-10.668
3D body: height 8, standoff 7.5, extent -1.016,-11.168 1.016,-10.668
3D body: height 8, standoff 7.5, extent -1.016,-9.652 1.016,-9.152
3D body: height 8, standoff 7.5, extent -1.008,-11.201 -0.508,-9.169
3D body: height 8, standoff 0, extent -1.27,-9.169 1.27,-8.89
3D body: height 1, standoff 0, extent -0.635,-10.795 0.635,-9.525
3D body: height 7, standoff 0, extent 0.483,-10.693 0.533,-9.627
3D body: height 7, standoff 0, extent -0.533,-10.693 0.533,-10.643
3D body: height 7, standoff 0, extent -0.533,-10.693 -0.483,-9.627
3D body: height 8, standoff 0, extent -1.27,-11.43 -0.99,-8.89
3D body: height 0, standoff -3, extent -0.254,-10.287 0.254,-10.033
3D body: height 8, standoff 0, extent 0.991,-11.43 1.27,-8.89
3D body: height 8, standoff 0, extent -1.27,-11.43 1.27,-11.151
3D body: height 7.5, standoff 0, extent -0.533,-10.693 -0.508,-9.627
3D body: height 7.5, standoff 0, extent -0.533,-9.652 0.534,-9.627
3D body: height 7, standoff 0, extent -0.533,-9.677 0.533,-9.626
3D body: height 8, standoff 7.5, extent 3.048,-6.096 3.549,-4.064
3D body: height 7.5, standoff 0, extent 3.048,-8.153 3.074,-7.087
3D body: height 7.5, standoff 0, extent 2.007,-8.153 3.073,-8.128
3D body: height 8, standoff 7.5, extent 1.524,-8.628 3.556,-8.128
3D body: height 8, standoff 7.5, extent 3.048,-8.636 3.549,-6.604
3D body: height 8, standoff 7.5, extent 1.524,-7.112 3.556,-6.612
3D body: height 8, standoff 7.5, extent 1.532,-8.661 2.032,-6.629
3D body: height 8, standoff 0, extent 1.27,-6.629 3.81,-6.35
3D body: height 1, standoff 0, extent 1.905,-8.255 3.175,-6.985
3D body: height 7, standoff 0, extent 3.023,-8.153 3.073,-7.087
3D body: height 7, standoff 0, extent 2.007,-8.153 3.073,-8.103
3D body: height 7, standoff 0, extent 2.007,-8.153 2.057,-7.087
3D body: height 8, standoff 0, extent 1.27,-8.89 1.55,-6.35
3D body: height 0, standoff -3, extent 2.286,-7.747 2.794,-7.493
3D body: height 8, standoff 0, extent 3.531,-8.89 3.81,-6.35
3D body: height 8, standoff 0, extent 1.27,-8.89 3.81,-8.611
3D body: height 7.5, standoff 0, extent 2.007,-8.153 2.032,-7.087
3D body: height 7.5, standoff 0, extent 2.007,-7.112 3.074,-7.087
3D body: height 7, standoff 0, extent 2.007,-7.137 3.073,-7.086
3D body: height 7.5, standoff 0, extent 3.048,-5.613 3.074,-4.547
3D body: height 7.5, standoff 0, extent 2.007,-5.613 3.073,-5.588
3D body: height 8, standoff 7.5, extent 1.524,-6.088 3.556,-5.588
3D body: height 8, standoff 7.5, extent 1.524,-4.572 3.556,-4.072
3D body: height 8, standoff 7.5, extent 1.532,-6.121 2.032,-4.089
3D body: height 8, standoff 0, extent 1.27,-4.089 3.81,-3.81
3D body: height 1, standoff 0, extent 1.905,-5.715 3.175,-4.445
3D body: height 7, standoff 0, extent 3.023,-5.613 3.073,-4.547
3D body: height 7, standoff 0, extent 2.007,-5.613 3.073,-5.563
3D body: height 7, standoff 0, extent 2.007,-5.613 2.057,-4.547
3D body: height 8, standoff 0, extent 1.27,-6.35 1.55,-3.81
3D body: height 0, standoff -3, extent 2.286,-5.207 2.794,-4.953
3D body: height 8, standoff 0, extent 3.531,-6.35 3.81,-3.81
3D body: height 8, standoff 0, extent 1.27,-6.35 3.81,-6.071
3D body: height 7.5, standoff 0, extent 2.007,-5.613 2.032,-4.547
3D body: height 7.5, standoff 0, extent 2.007,-4.572 3.074,-4.547
3D body: height 7, standoff 0, extent 2.007,-4.597 3.073,-4.546
3D body: height 8, standoff 7.5, extent 0.508,-6.096 1.009,-4.064
3D body: height 7.5, standoff 0, extent 0.508,-8.153 0.534,-7.087
3D body: height 7.5, standoff 0, extent -0.533,-8.153 0.533,-8.128
3D body: height 8, standoff 7.5, extent -1.016,-8.628 1.016,-8.128
3D body: height 8, standoff 7.5, extent 0.508,-8.636 1.009,-6.604
3D body: height 8, standoff 7.5, extent -1.016,-7.112 1.016,-6.612
3D body: height 8, standoff 7.5, extent -1.008,-8.661 -0.508,-6.629
3D body: height 8, standoff 0, extent -1.27,-6.629 1.27,-6.35
3D body: height 1, standoff 0, extent -0.635,-8.255 0.635,-6.985
3D body: height 7, standoff 0, extent 0.483,-8.153 0.533,-7.087
3D body: height 7, standoff 0, extent -0.533,-8.153 0.533,-8.103
3D body: height 7, standoff 0, extent -0.533,-8.153 -0.483,-7.087
3D body: height 8, standoff 0, extent -1.27,-8.89 -0.99,-6.35
3D body: height 0, standoff -3, extent -0.254,-7.747 0.254,-7.493
3D body: height 8, standoff 0, extent 0.991,-8.89 1.27,-6.35
3D body: height 8, standoff 0, extent -1.27,-8.89 1.27,-8.611
3D body: height 7.5, standoff 0, extent -0.533,-8.153 -0.508,-7.087
3D body: height 7.5, standoff 0, extent -0.533,-7.112 0.534,-7.087
3D body: height 7, standoff 0, extent -0.533,-7.137 0.533,-7.086
3D body: height 7.5, standoff 0, extent 0.508,-5.613 0.534,-4.547
3D body: height 7.5, standoff 0, extent -0.533,-5.613 0.533,-5.588
3D body: height 8, standoff 7.5, extent -1.016,-6.088 1.016,-5.588
3D body: height 8, standoff 7.5, extent -1.016,-4.572 1.016,-4.072
3D body: height 8, standoff 7.5, extent -1.008,-6.121 -0.508,-4.089
3D body: height 8, standoff 0, extent -1.27,-4.089 1.27,-3.81
3D body: height 1, standoff 0, extent -0.635,-5.715 0.635,-4.445
3D body: height 7, standoff 0, extent 0.483,-5.613 0.533,-4.547
3D body: height 7, standoff 0, extent -0.533,-5.613 0.533,-5.563
3D body: height 7, standoff 0, extent -0.533,-5.613 -0.483,-4.547
3D body: height 8, standoff 0, extent -1.27,-6.35 -0.99,-3.81
3D body: height 0, standoff -3, extent -0.254,-5.207 0.254,-4.953
3D body: height 8, standoff 0, extent 0.991,-6.35 1.27,-3.81
3D body: height 8, standoff 0, extent -1.27,-6.35 1.27,-6.071
3D body: height 7.5, standoff 0, extent -0.533,-5.613 -0.508,-4.547
3D body: height 7.5, standoff 0, extent -0.533,-4.572 0.534,-4.547
3D body: height 7, standoff 0, extent -0.533,-4.597 0.533,-4.546
3D body: height 8, standoff 7.5, extent 3.048,-1.016 3.549,1.016
3D body: height 7.5, standoff 0, extent 3.048,-3.074 3.074,-2.007
3D body: height 7.5, standoff 0, extent 2.007,-3.073 3.074,-3.048
3D body: height 8, standoff 7.5, extent 1.524,-3.549 3.556,-3.048
3D body: height 8, standoff 7.5, extent 3.048,-3.556 3.549,-1.524
3D body: height 8, standoff 7.5, extent 1.524,-2.032 3.556,-1.532
3D body: height 8, standoff 7.5, extent 1.532,-3.581 2.032,-1.549
3D body: height 8, standoff 0, extent 1.27,-1.55 3.81,-1.27
3D body: height 1, standoff 0, extent 1.905,-3.175 3.175,-1.905
3D body: height 7, standoff 0, extent 3.023,-3.073 3.074,-2.007
3D body: height 7, standoff 0, extent 2.007,-3.073 3.074,-3.023
3D body: height 7, standoff 0, extent 2.007,-3.073 2.058,-2.007
3D body: height 8, standoff 0, extent 1.27,-3.81 1.55,-1.27
3D body: height 0, standoff -3, extent 2.286,-2.667 2.794,-2.413
3D body: height 8, standoff 0, extent 3.531,-3.81 3.81,-1.27
3D body: height 8, standoff 0, extent 1.27,-3.81 3.81,-3.531
3D body: height 7.5, standoff 0, extent 2.007,-3.073 2.032,-2.007
3D body: height 7.5, standoff 0, extent 2.007,-2.032 3.074,-2.007
3D body: height 7, standoff 0, extent 2.007,-2.057 3.074,-2.006
3D body: height 7.5, standoff 0, extent 3.048,-0.534 3.074,0.533
3D body: height 7.5, standoff 0, extent 2.007,-0.533 3.074,-0.508
3D body: height 8, standoff 7.5, extent 1.524,-1.009 3.556,-0.508
3D body: height 8, standoff 7.5, extent 1.524,0.508 3.556,1.008
3D body: height 8, standoff 7.5, extent 1.532,-1.041 2.032,0.991
3D body: height 8, standoff 0, extent 1.27,0.99 3.81,1.27
3D body: height 1, standoff 0, extent 1.905,-0.635 3.175,0.635
3D body: height 7, standoff 0, extent 3.023,-0.533 3.074,0.533
3D body: height 7, standoff 0, extent 2.007,-0.533 3.074,-0.483
3D body: height 7, standoff 0, extent 2.007,-0.533 2.058,0.533
3D body: height 8, standoff 0, extent 1.27,-1.27 1.55,1.27
3D body: height 0, standoff -3, extent 2.286,-0.127 2.794,0.127
3D body: height 8, standoff 0, extent 3.531,-1.27 3.81,1.27
3D body: height 8, standoff 0, extent 1.27,-1.27 3.81,-0.991
3D body: height 7.5, standoff 0, extent 2.007,-0.533 2.032,0.533
3D body: height 7.5, standoff 0, extent 2.007,0.508 3.074,0.533
3D body: height 7, standoff 0, extent 2.007,0.483 3.074,0.534
3D body: height 8, standoff 7.5, extent 0.508,-1.016 1.009,1.016
3D body: height 7.5, standoff 0, extent 0.508,-3.074 0.534,-2.007
3D body: height 7.5, standoff 0, extent -0.533,-3.073 0.534,-3.048
3D body: height 8, standoff 7.5, extent -1.016,-3.549 1.016,-3.048
3D body: height 8, standoff 7.5, extent 0.508,-3.556 1.009,-1.524
3D body: height 8, standoff 7.5, extent -1.016,-2.032 1.016,-1.532
3D body: height 8, standoff 7.5, extent -1.008,-3.581 -0.508,-1.549
3D body: height 8, standoff 0, extent -1.27,-1.55 1.27,-1.27
3D body: height 1, standoff 0, extent -0.635,-3.175 0.635,-1.905
3D body: height 7, standoff 0, extent 0.483,-3.073 0.534,-2.007
3D body: height 7, standoff 0, extent -0.533,-3.073 0.534,-3.023
3D body: height 7, standoff 0, extent -0.533,-3.073 -0.482,-2.007
3D body: height 8, standoff 0, extent -1.27,-3.81 -0.99,-1.27
3D body: height 0, standoff -3, extent -0.254,-2.667 0.254,-2.413
3D body: height 8, standoff 0, extent 0.991,-3.81 1.27,-1.27
3D body: height 8, standoff 0, extent -1.27,-3.81 1.27,-3.531
3D body: height 7.5, standoff 0, extent -0.533,-3.073 -0.508,-2.007
3D body: height 7.5, standoff 0, extent -0.533,-2.032 0.534,-2.007
3D body: height 7, standoff 0, extent -0.533,-2.057 0.534,-2.006
3D body: height 7.5, standoff 0, extent 0.508,-0.534 0.534,0.533
3D body: height 7.5, standoff 0, extent -0.533,-0.533 0.534,-0.508
3D body: height 8, standoff 7.5, extent -1.016,-1.009 1.016,-0.508
3D body: height 8, standoff 7.5, extent -1.016,0.508 1.016,1.008
3D body: height 8, standoff 7.5, extent -1.008,-1.041 -0.508,0.991
3D body: height 8, standoff 0, extent -1.27,0.99 1.27,1.27
3D body: height 1, standoff 0, extent -0.635,-0.635 0.635,0.635
3D body: height 7, standoff 0, extent 0.483,-0.533 0.534,0.533
3D body: height 7, standoff 0, extent -0.533,-0.533 0.534,-0.483
3D body: height 7, standoff 0, extent -0.533,-0.533 -0.482,0.533
3D body: height 8, standoff 0, extent -1.27,-1.27 -0.99,1.27
3D body: height 0, standoff -3, extent -0.254,-0.127 0.254,0.127
3D body: height 8, standoff 0, extent 0.991,-1.27 1.27,1.27
3D body: height 8, standoff 0, extent -1.27,-1.27 1.27,-0.991
3D body: height 7.5, standoff 0, extent -0.533,-0.533 -0.508,0.533
3D body: height 7.5, standoff 0, extent -0.533,0.508 0.534,0.533
3D body: height 7, standoff 0, extent -0.533,0.483 0.534,0.534